# Altium schematic symbol library Schlib.SchLib: 725 symbols (part 3 of 6) (continued)
## ERJ-2RKF2000X
designator R?  value 200R  (hidden comment: *)
Res Thick Film 0402 200 Ohm 1% 1/10W ±100ppm/°C Molded SMD Punched Carrier T/R; Manufacturer: Panasonic; Manufacturer Part Number: ERJ-2RKF2000X; Power Rating: 100mW; Voltage Rating: 50V; Supplier: Digi-Key; Supplier Part Number: P200LCT-ND; RoHS: Yes; Category: Chip SMD Resistors; Stock: 2687188; Pricing: 1=0.10000, 10=0.03400, 100=0.01390, 1000=0.00625, 2500=0.00543, 5000=0.00448 (USD); Mounting Technology: Surface Mount; Case/Package: 0402; Case Code (Metric): 1005; Case Code (Imperial): 0402; Contact Plating: Tin; Min Operating Temperature: -55°C; Max Operating Temperature: 155°C; Tolerance: 1%; Packaging: Tape and Reel; Package Quantity: 1; Resistor Type: Thick Film; Number of Terminations: 2; Termination: SMD/SMT; Temperature Coefficient: 100ppm/°C; Max Power Dissipation: 100mW; Voltage Rating (DC): 50V; Features: Automotive AEC-Q200; Series: ERJ; Technology: THICK FILM; Resistance Tolerance: 1%; Construction: Rectangular; Length: 1mm; Width: 0.5mm; Height: 0.35mm; Depth: 0.5mm; Radiation Hardening: No; Reach SVHC Compliant: Yes; Military Standard: Not; Lead Free: Lead Free; RoHS Compliant: Yes; ComponentLink1URL: https://datasheet.ciiva.com/43460/426256-43460283.pdf?src-supplier=Farnell; ComponentLink1Description: https://datasheet.ciiva.com/43460/426256-43460283.pdf?src-supplier=Farnell; ComponentLink2URL: https://datasheet.ciiva.com/22748/426256-22748296.pdf?src-supplier=Element14; ComponentLink2Description: https://datasheet.ciiva.com/22748/426256-22748296.pdf?src-supplier=Element14; ComponentLink3URL: https://datasheet.ciiva.com/6137/426256-6137544.pdf?src-supplier=Farnell; ComponentLink3Description: https://datasheet.ciiva.com/6137/426256-6137544.pdf?src-supplier=Farnell; ComponentLink4URL: https://datasheet.ciiva.com/22748/426256-22748294.pdf?src-supplier=Element14; ComponentLink4Description: https://datasheet.ciiva.com/22748/426256-22748294.pdf?src-supplier=Element14; ComponentLink5URL: https://datasheet.ciiva.com/22749/1678782-22749583.pdf?src-supplier=Element14; ComponentLink5Description: https://datasheet.ciiva.com/22749/1678782-22749583.pdf?src-supplier=Element14; ComponentLink6URL: https://datasheet.ciiva.com/28691/1678782-28691926.pdf?src-supplier=Element14; ComponentLink6Description: https://datasheet.ciiva.com/28691/1678782-28691926.pdf?src-supplier=Element14; ComponentLink7URL: https://datasheet.ciiva.com/24024/aoa0000ce2-24024252.pdf?src-supplier=Mouser; ComponentLink7Description: https://datasheet.ciiva.com/24024/aoa0000ce2-24024252.pdf?src-supplier=Mouser; ComponentLink8URL: https://datasheet.ciiva.com/16758/70260748-16758862.pdf?src-supplier=Allied+Electronics; ComponentLink8Description: https://datasheet.ciiva.com/16758/70260748-16758862.pdf?src-supplier=Allied+Electronics; ComponentLink9URL: https://datasheet.ciiva.com/9184/aoa0000ce2-9184574.pdf?src-supplier=Avnet; ComponentLink9Description: https://datasheet.ciiva.com/9184/aoa0000ce2-9184574.pdf?src-supplier=Avnet; ComponentLink10URL: https://datasheet.ciiva.com/16449/aoa0000ce2-16449365.pdf?src-supplier=Future+Electronics; ComponentLink10Description: https://datasheet.ciiva.com/16449/aoa0000ce2-16449365.pdf?src-supplier=Future+Electronics
footprint R 0402 (1005 Metric) (Chip Capacitor, Body 1.0x0.5mm, IPC High Density)
pins: 1 B, 2 A
1 alternate drawing of the same symbol

## ERJ-2RKF2002X
designator R?  value 20kR  (hidden comment: *)
Res Thick Film 0402 20K Ohm 1% 1/10W +/-100ppm/ßC Molded SMD Punched Carrier T/R; Manufacturer: Panasonic; Manufacturer Part Number: ERJ-2RKF2002X; Power Rating: 100mW; Voltage Rating: 50V; Temperature Coefficient: 100ppm/°C; Supplier: Digi-Key; Supplier Part Number: P20.0KLTR-ND; RoHS: Yes; Category: Chip SMD Resistors; Stock: 2592473; Pricing: 10000=0.00389, 30000=0.00342, 50000=0.00314, 100000=0.00308 (USD); Mounting Technology: Surface Mount; Case/Package: 0402; Case Code (Metric): 1005; Case Code (Imperial): 0402; Weight: 2.8E-05oz; Contact Plating: Tin; Min Operating Temperature: -55°C; Max Operating Temperature: 155°C; Tolerance: 1%; Packaging: Cut Tape; Package Quantity: 1; Resistor Type: Thick Film; Number of Terminations: 2; Termination: SMD/SMT; Max Power Dissipation: 100mW; Voltage Rating (DC): 50V; Features: Automotive AEC-Q200; Series: ERJ; Technology: THICK FILM; Resistance Tolerance: 1%; Construction: Rectangular; Length: 1mm; Width: 0.5mm; Height: 0.35mm; Depth: 0.5mm; Radiation Hardening: No; Reach SVHC Compliant: Yes; Military Standard: Not; Lead Free: Lead Free; RoHS Compliant: Yes; ComponentLink1URL: https://datasheet.ciiva.com/11821/0900766b80f80784-11821220.pdf?src-supplier=Rs; ComponentLink1Description: https://datasheet.ciiva.com/11821/0900766b80f80784-11821220.pdf?src-supplier=Rs; ComponentLink2URL: https://datasheet.ciiva.com/6138/426256-6138761.pdf?src-supplier=Farnell; ComponentLink2Description: https://datasheet.ciiva.com/6138/426256-6138761.pdf?src-supplier=Farnell; ComponentLink3URL: https://datasheet.ciiva.com/46377/426256-46377368.pdf?src-supplier=Element14; ComponentLink3Description: https://datasheet.ciiva.com/46377/426256-46377368.pdf?src-supplier=Element14; ComponentLink4URL: https://datasheet.ciiva.com/28688/1678782-28688600.pdf?src-supplier=Element14; ComponentLink4Description: https://datasheet.ciiva.com/28688/1678782-28688600.pdf?src-supplier=Element14; ComponentLink5URL: https://datasheet.ciiva.com/24159/aoa0000ce2-24159274.pdf?src-supplier=Mouser; ComponentLink5Description: https://datasheet.ciiva.com/24159/aoa0000ce2-24159274.pdf?src-supplier=Mouser; ComponentLink6URL: https://datasheet.ciiva.com/16782/70260748-16782455.pdf?src-supplier=Allied+Electronics; ComponentLink6Description: https://datasheet.ciiva.com/16782/70260748-16782455.pdf?src-supplier=Allied+Electronics; ComponentLink7URL: https://datasheet.ciiva.com/16762/70260748-16762885.pdf?src-supplier=Allied+Electronics; ComponentLink7Description: https://datasheet.ciiva.com/16762/70260748-16762885.pdf?src-supplier=Allied+Electronics; ComponentLink8URL: https://datasheet.ciiva.com/16508/aoa0000ce2-16508524.pdf?src-supplier=Future+Electronics; ComponentLink8Description: https://datasheet.ciiva.com/16508/aoa0000ce2-16508524.pdf?src-supplier=Future+Electronics; ComponentLink9URL: https://datasheet.ciiva.com/48531/aoa0000ce2-48531063.pdf?src-supplier=Avnet; ComponentLink9Description: https://datasheet.ciiva.com/48531/aoa0000ce2-48531063.pdf?src-supplier=Avnet; ComponentLink10URL: https://datasheet.ciiva.com/30049/aoa0000ce2-30049982.pdf?src-supplier=Onlinecomponents.com; ComponentLink10Description: https://datasheet.ciiva.com/30049/aoa0000ce2-30049982.pdf?src-supplier=Onlinecomponents.com
footprint R 0402 (1005 Metric) (Chip Capacitor, Body 1.0x0.5mm, IPC High Density)
pins: 1 B, 2 A

## ERJ-2RKF2003X
designator R?  value 200kR  (hidden comment: *)
RES SMD 200K OHM 1% 1/10W 0402; Manufacturer: Panasonic; Manufacturer Part Number: ERJ-2RKF2003X; Power Rating: 100mW; Voltage Rating: 50V; Temperature Coefficient: 100ppm/°C; Supplier: Digi-Key; Supplier Part Number: P200KLCT-ND; RoHS: Yes; Category: Chip SMD Resistors; Stock: 785672; Pricing: 1=0.10000, 10=0.03400, 100=0.01390, 1000=0.00625, 2500=0.00543, 5000=0.00448 (USD); Mounting Technology: Surface Mount; Case/Package: 0402; Pins: 2; Case Code (Imperial): 0402; Case Code (Metric): 1005; Contact Plating: Tin; Package Shape: Rectangular; Min Operating Temperature: -55°C; Max Operating Temperature: 155°C; Tolerance: 1%; Packaging: Tape and Reel; Package Quantity: 1; Termination: SMD/SMT; Resistor Type: Thick Film; Number of Terminations: 2; Max Power Dissipation: 100mW; Voltage Rating (DC): 50V; Features: Automotive AEC-Q200; Technology: THICK FILM; Length: 1mm; Width: 0.5mm; Height: 0.35mm; Depth: 0.5mm; Radiation Hardening: No; Reach SVHC Compliant: Yes; Military Standard: Not; Lead Free: Lead Free; RoHS Compliant: Yes
footprint R 0402 (1005 Metric) (Chip Capacitor, Body 1.0x0.5mm, IPC High Density)
pins: 1 B, 2 A

## ERJ-2RKF2103X
designator R?  value 210kR  (hidden comment: *)
SMD Chip Resistor, 210 kOhm, ± 1%, 100 mW, 0402 [1005 Metric], Thick Film, Precision; Manufacturer: Panasonic; Manufacturer Part Number: ERJ-2RKF2103X; Supplier: Digikey; Supplier Part Number: P210KLCT-ND; RoHS: Yes; Category: Chip SMD Resistors; Stock: 76576; Pricing: 1=0.1, 10=0.024, 50=0.0152, 100=0.0127, 500=0.00866, 1000=0.00746, 5000=0.00542 (USD); ComponentLink1URL: https://datasheet.ciiva.com/24026/aoa0000ce2-24026251.pdf?src-supplier=Mouser; ComponentLink1Description: https://datasheet.ciiva.com/24026/aoa0000ce2-24026251.pdf?src-supplier=Mouser; ComponentLink2URL: https://datasheet.ciiva.com/46373/1678782-46373144.pdf?src-supplier=Element14; ComponentLink2Description: https://datasheet.ciiva.com/46373/1678782-46373144.pdf?src-supplier=Element14; ComponentLink3URL: https://datasheet.ciiva.com/46373/1678782-46373145.pdf?src-supplier=Element14; ComponentLink3Description: https://datasheet.ciiva.com/46373/1678782-46373145.pdf?src-supplier=Element14; ComponentLink4URL: https://datasheet.ciiva.com/22673/1678782-22673338.pdf?src-supplier=Element14; ComponentLink4Description: https://datasheet.ciiva.com/22673/1678782-22673338.pdf?src-supplier=Element14; ComponentLink5URL: https://datasheet.ciiva.com/28531/1694929-28531417.pdf?src-supplier=Element14; ComponentLink5Description: https://datasheet.ciiva.com/28531/1694929-28531417.pdf?src-supplier=Element14; ComponentLink6URL: https://datasheet.ciiva.com/16770/70260748-16770519.pdf?src-supplier=Allied+Electronics; ComponentLink6Description: https://datasheet.ciiva.com/16770/70260748-16770519.pdf?src-supplier=Allied+Electronics; ComponentLink7URL: https://datasheet.ciiva.com/9184/aoa0000ce2-9184527.pdf?src-supplier=Avnet; ComponentLink7Description: https://datasheet.ciiva.com/9184/aoa0000ce2-9184527.pdf?src-supplier=Avnet; ComponentLink8URL: https://datasheet.ciiva.com/30072/aoa0000ce2-30072110.pdf?src-supplier=Onlinecomponents.com; ComponentLink8Description: https://datasheet.ciiva.com/30072/aoa0000ce2-30072110.pdf?src-supplier=Onlinecomponents.com; ComponentLink9URL: https://datasheet.ciiva.com/7712/1678782-7712806.pdf?src-supplier=Element14; ComponentLink9Description: https://datasheet.ciiva.com/7712/1678782-7712806.pdf?src-supplier=Element14; Case/Package: 0402
footprint R 0402 (1005 Metric) (Chip Capacitor, Body 1.0x0.5mm, IPC High Density)
pins: 1 B, 2 A

## ERJ-2RKF2201X
designator R?  value 2.2kR  (hidden comment: *)
RES SMD 2.2K OHM 1% 1/10W 0402; Manufacturer: Panasonic; Manufacturer Part Number: ERJ-2RKF2201X; Temperature Coefficient: 100ppm/°C; Power Rating: 100mW; Voltage Rating: 50V; Supplier: Digi-Key; Supplier Part Number: P2.20KLCT-ND; RoHS: Yes; Category: Chip SMD Resistors; Stock: 3525012; Pricing: 1=0.10000, 10=0.03400, 100=0.01390, 1000=0.00625, 2500=0.00543, 5000=0.00448 (USD); Mounting Technology: Surface Mount; Case/Package: 0402; Pins: 2; Contact Plating: Tin; Case Code (Imperial): 0402; Case Code (Metric): 1005; Weight: 2.8E-05oz; Min Operating Temperature: -55°C; Max Operating Temperature: 155°C; Tolerance: 1%; Resistor Type: Thick Film; Packaging: Tape and Reel; Package Quantity: 1; Termination: SMD/SMT; Number of Terminations: 2; Max Power Dissipation: 100mW; Voltage Rating (DC): 50V; Features: Automotive AEC-Q200; Series: ERJ; Resistance Tolerance: 1%; Construction: Rectangular; Technology: THICK FILM; Length: 1mm; Width: 0.5mm; Height: 0.35mm; Depth: 0.5mm; Radiation Hardening: No; Reach SVHC Compliant: Yes; Military Standard: Not; Lead Free: Lead Free; RoHS Compliant: Yes; ComponentLink1URL: https://datasheet.ciiva.com/11821/0900766b80f80784-11821273.pdf?src-supplier=Rs; ComponentLink1Description: https://datasheet.ciiva.com/11821/0900766b80f80784-11821273.pdf?src-supplier=Rs; ComponentLink2URL: https://datasheet.ciiva.com/7830/aoa0000ce2-7830726.pdf?src-supplier=Element14; ComponentLink2Description: https://datasheet.ciiva.com/7830/aoa0000ce2-7830726.pdf?src-supplier=Element14; ComponentLink3URL: https://datasheet.ciiva.com/43467/1678782-43467343.pdf?src-supplier=Farnell; ComponentLink3Description: https://datasheet.ciiva.com/43467/1678782-43467343.pdf?src-supplier=Farnell; ComponentLink4URL: https://datasheet.ciiva.com/46372/1678782-46372732.pdf?src-supplier=Element14; ComponentLink4Description: https://datasheet.ciiva.com/46372/1678782-46372732.pdf?src-supplier=Element14; ComponentLink5URL: https://datasheet.ciiva.com/28584/1678782-28584091.pdf?src-supplier=Element14; ComponentLink5Description: https://datasheet.ciiva.com/28584/1678782-28584091.pdf?src-supplier=Element14; ComponentLink6URL: https://datasheet.ciiva.com/46372/1678782-46372733.pdf?src-supplier=Element14; ComponentLink6Description: https://datasheet.ciiva.com/46372/1678782-46372733.pdf?src-supplier=Element14; ComponentLink7URL: https://datasheet.ciiva.com/16759/70260748-16759436.pdf?src-supplier=Allied+Electronics; ComponentLink7Description: https://datasheet.ciiva.com/16759/70260748-16759436.pdf?src-supplier=Allied+Electronics; ComponentLink8URL: https://datasheet.ciiva.com/16780/70260748-16780438.pdf?src-supplier=Allied+Electronics; ComponentLink8Description: https://datasheet.ciiva.com/16780/70260748-16780438.pdf?src-supplier=Allied+Electronics; ComponentLink9URL: https://datasheet.ciiva.com/9197/aoa0000ce2-9197306.pdf?src-supplier=Avnet; ComponentLink9Description: https://datasheet.ciiva.com/9197/aoa0000ce2-9197306.pdf?src-supplier=Avnet; ComponentLink10URL: https://datasheet.ciiva.com/16426/aoa0000ce2-16426745.pdf?src-supplier=Future+Electronics; ComponentLink10Description: https://datasheet.ciiva.com/16426/aoa0000ce2-16426745.pdf?src-supplier=Future+Electronics; ComponentLink11URL: https://datasheet.ciiva.com/48531/aoa0000ce2-48531066.pdf?src-supplier=Avnet; ComponentLink11Description: https://datasheet.ciiva.com/48531/aoa0000ce2-48531066.pdf?src-supplier=Avnet
footprint R 0402 (1005 Metric) (Chip Capacitor, Body 1.0x0.5mm, IPC High Density)
pins: 1 B, 2 A

## ERJ-2RKF2322X
designator R?  value 23.2kR  (hidden comment: *)
SMD Chip Resistor, 23.2 kOhm, ± 1%, 100 mW, 0402 [1005 Metric], Thick Film, Precision; Manufacturer: Panasonic; Manufacturer Part Number: ERJ-2RKF2322X; Voltage Rating (DC): 50V; Power Rating: 100mW; Temperature Coefficient: 100ppm/°C; Supplier: Digikey; Supplier Part Number: P23.2KLCT-ND; RoHS: Yes; Category: Chip SMD Resistors; Stock: 9034; Pricing: 1=0.1, 10=0.024, 50=0.0152, 100=0.0127, 500=0.00866, 1000=0.00746, 5000=0.00542 (USD); Mounting Technology: Surface Mount; Case/Package: 0402; Case Code (Metric): 1005; Case Code (Imperial): 0402; Contact Plating: Tin; Min Operating Temperature: -55°C; Max Operating Temperature: 155°C; Tolerance: 1%; Voltage Rating: 50V; Packaging: Tape and Reel; Package Quantity: 10000; Resistor Type: Thick Film; Number of Terminations: 2; Termination: SMD/SMT; Max Power Dissipation: 100mW; Features: Automotive AEC-Q200; Series: ERJ; Resistance Tolerance: 1%; Construction: Rectangular; Length: 1mm; Width: 0.5mm; Height: 0.35mm; Depth: 0.5mm; Ratings: AEC-Q200; Radiation Hardening: No; Reach SVHC Compliant: Yes; Military Standard: Not; RoHS Compliant: Yes; Lead Free: 5697LeadFree; ComponentLink1URL: https://datasheet.ciiva.com/22668/1678782-22668630.pdf?src-supplier=Element14; ComponentLink1Description: https://datasheet.ciiva.com/22668/1678782-22668630.pdf?src-supplier=Element14; ComponentLink2URL: https://datasheet.ciiva.com/46372/1678782-46372991.pdf?src-supplier=Element14; ComponentLink2Description: https://datasheet.ciiva.com/46372/1678782-46372991.pdf?src-supplier=Element14
footprint R 0402 (1005 Metric) (Chip Capacitor, Body 1.0x0.5mm, IPC High Density)
pins: 1 B, 2 A

## ERJ-2RKF2401X
designator R?  value 2.4kR  (hidden comment: *)
Res Thick Film 0402 2.4K Ohm 1% 0.1W ±100ppm/°C Molded SMD Punched Carrier T/R; Manufacturer: Panasonic; Manufacturer Part Number: ERJ-2RKF2401X; Power Rating: 100mW; Voltage Rating: 50V; Supplier: Mouser; Supplier Part Number: 667-ERJ-2RKF2401X; RoHS: Yes; Category: Chip SMD Resistors; Stock: 69566; Pricing: 1=0.1, 10=0.016, 50=0.016, 100=0.009, 1000=0.007, 10000=0.004 (USD); Mounting Technology: Surface Mount; Case/Package: 0402; Case Code (Metric): 1005; Case Code (Imperial): 0402; Contact Plating: Tin; Min Operating Temperature: -55°C; Max Operating Temperature: 155°C; Tolerance: 1%; Packaging: Tape and Reel; Package Quantity: 10000; Resistor Type: Thick Film; Number of Terminations: 2; Termination: SMD/SMT; Temperature Coefficient: 100ppm/°C; Max Power Dissipation: 100mW; Voltage Rating (DC): 50V; Series: ERJ; Resistance Tolerance: 1%; Technology: THICK FILM; Construction: Rectangular; Length: 1mm; Width: 0.5mm; Height: 0.35mm; Depth: 0.5mm; Reach SVHC Compliant: No; Military Standard: Not; Lead Free: Lead Free; RoHS Compliant: Yes; ComponentLink1URL: https://datasheet.ciiva.com/11821/0900766b80f80784-11821271.pdf?src-supplier=Rs; ComponentLink1Description: https://datasheet.ciiva.com/11821/0900766b80f80784-11821271.pdf?src-supplier=Rs; ComponentLink2URL: https://datasheet.ciiva.com/16759/70260748-16759852.pdf?src-supplier=Allied+Electronics; ComponentLink2Description: https://datasheet.ciiva.com/16759/70260748-16759852.pdf?src-supplier=Allied+Electronics; ComponentLink3URL: https://datasheet.ciiva.com/30095/aoa0000ce2-30095942.pdf?src-supplier=Onlinecomponents.com; ComponentLink3Description: https://datasheet.ciiva.com/30095/aoa0000ce2-30095942.pdf?src-supplier=Onlinecomponents.com; ComponentLink4URL: https://datasheet.ciiva.com/22673/1678782-22673273.pdf?src-supplier=Element14; ComponentLink4Description: https://datasheet.ciiva.com/22673/1678782-22673273.pdf?src-supplier=Element14; ComponentLink5URL: https://datasheet.ciiva.com/28565/1694929-28565018.pdf?src-supplier=Element14; ComponentLink5Description: https://datasheet.ciiva.com/28565/1694929-28565018.pdf?src-supplier=Element14; ComponentLink6URL: https://datasheet.ciiva.com/46373/1678782-46373087.pdf?src-supplier=Element14; ComponentLink6Description: https://datasheet.ciiva.com/46373/1678782-46373087.pdf?src-supplier=Element14
footprint R 0402 (1005 Metric) (Chip Capacitor, Body 1.0x0.5mm, IPC High Density)
pins: 1 B, 2 A

## ERJ-2RKF2700X
designator R?  value 270R  (hidden comment: *)
Res Thick Film 0402 270 Ohm 1% 0.1W(1/10W) +/-100ppm/C Molded SMD Automotive Punched T/R; Manufacturer: Panasonic; Manufacturer Part Number: ERJ-2RKF2700X; Temperature Coefficient: 100ppm/°C; Power Rating: 100mW; Voltage Rating: 50V; Supplier 1: Digi-Key; RoHS: Yes; Category: Chip SMD Resistors; Stock 1: 46983; Pricing 1: 1=0.10000, 10=0.03400, 100=0.01390, 1000=0.00625, 2500=0.00543, 5000=0.00448 (USD); Mount: Surface Mount; Case/Package: 0402; Number of Pins: 2; Contact Plating: Tin; Case Code (Metric): 1005; Case Code (Imperial): 0402; Min Operating Temperature: -55°C; Max Operating Temperature: 155°C; Tolerance: 1%; Resistor Type: Thick Film; Packaging: Tape and Reel; Package Quantity: 10000; Number of Terminations: 2; Termination: SMD/SMT; Max Power Dissipation: 100mW; Voltage Rating (DC): 50V; Features: Automotive AEC-Q200; Series: ERJ; Resistance Tolerance: 1%; Construction: Rectangular; Technology: THICK FILM; Length: 1mm; Width: 0.5mm; Height: 0.35mm; Depth: 0.5mm; Ratings: AEC-Q200; Radiation Hardening: No; Reach SVHC Compliant: Yes; Military Standard: Not; Lead Free: Lead Free; RoHS Compliant: Yes; ComponentLink1URL: https://datasheet.ciiva.com/11821/0900766b80f80784-11821240.pdf?src-supplier=Rs; ComponentLink1Description: https://datasheet.ciiva.com/11821/0900766b80f80784-11821240.pdf?src-supplier=Rs; ComponentLink2URL: https://datasheet.ciiva.com/5860/aoa0000ce2-5860650.pdf?src-supplier=Farnell; ComponentLink2Description: https://datasheet.ciiva.com/5860/aoa0000ce2-5860650.pdf?src-supplier=Farnell; ComponentLink3URL: https://datasheet.ciiva.com/7944/aoa0000ce2-7944606.pdf?src-supplier=Element14; ComponentLink3Description: https://datasheet.ciiva.com/7944/aoa0000ce2-7944606.pdf?src-supplier=Element14; ComponentLink4URL: https://datasheet.ciiva.com/7944/aoa0000ce2-7944940.pdf?src-supplier=Element14; ComponentLink4Description: https://datasheet.ciiva.com/7944/aoa0000ce2-7944940.pdf?src-supplier=Element14; ComponentLink5URL: https://datasheet.ciiva.com/43467/1678782-43467257.pdf?src-supplier=Farnell; ComponentLink5Description: https://datasheet.ciiva.com/43467/1678782-43467257.pdf?src-supplier=Farnell; ComponentLink6URL: https://datasheet.ciiva.com/46373/1678782-46373915.pdf?src-supplier=Element14; ComponentLink6Description: https://datasheet.ciiva.com/46373/1678782-46373915.pdf?src-supplier=Element14; ComponentLink7URL: https://datasheet.ciiva.com/22705/1678782-22705421.pdf?src-supplier=Element14; ComponentLink7Description: https://datasheet.ciiva.com/22705/1678782-22705421.pdf?src-supplier=Element14; ComponentLink8URL: https://datasheet.ciiva.com/46373/1678782-46373916.pdf?src-supplier=Element14; ComponentLink8Description: https://datasheet.ciiva.com/46373/1678782-46373916.pdf?src-supplier=Element14; ComponentLink9URL: https://datasheet.ciiva.com/24069/aoa0000ce2-24069133.pdf?src-supplier=Mouser; ComponentLink9Description: https://datasheet.ciiva.com/24069/aoa0000ce2-24069133.pdf?src-supplier=Mouser; ComponentLink10URL: https://datasheet.ciiva.com/16766/70260748-16766103.pdf?src-supplier=Allied+Electronics; ComponentLink10Description: https://datasheet.ciiva.com/16766/70260748-16766103.pdf?src-supplier=Allied+Electronics; ComponentLink11URL: https://datasheet.ciiva.com/16767/70260748-16767359.pdf?src-supplier=Allied+Electronics; ComponentLink11Description: https://datasheet.ciiva.com/16767/70260748-16767359.pdf?src-supplier=Allied+Electronics; ComponentLink12URL: https://datasheet.ciiva.com/9183/aoa0000ce2-9183566.pdf?src-supplier=Avnet; ComponentLink12Description: https://datasheet.ciiva.com/9183/aoa0000ce2-9183566.pdf?src-supplier=Avnet; ComponentLink13URL: https://datasheet.ciiva.com/9183/aoa0000ce2-9183598.pdf?src-supplier=Avnet; ComponentLink13Description: https://datasheet.ciiva.com/9183/aoa0000ce2-9183598.pdf?src-supplier=Avnet; ComponentLink14URL: https://datasheet.ciiva.com/30198/aoa0000ce2-30198389.pdf?src-supplier=Onlinecomponents.com; ComponentLink14Description: https://datasheet.ciiva.com/30198/aoa0000ce2-30198389.pdf?src-supplier=Onlinecomponents.com; Supplier Part Number 1: P270LCT-ND
footprint R 0402 (1005 Metric) (Chip Capacitor, Body 1.0x0.5mm, IPC High Density)
pins: 1 B, 2 A

## ERJ-2RKF2703X
designator R?  value 270kR  (hidden comment: *)
Res Thick Film 0402 270K Ohm 1% 1/10W ±100ppm/°C Molded SMD Punched Carrier T/R; Manufacturer: Panasonic; Manufacturer Part Number: ERJ-2RKF2703X; Power Rating: 100mW; Voltage Rating: 50V; Supplier 1: Avnet; RoHS: Yes; Category: Chip SMD Resistors; Stock 1: 40000; Pricing 1: 10000=0.00276 (USD); Mount: Surface Mount; Case/Package: 0402; Number of Pins: 2; Contact Plating: Tin; Case Code (Metric): 1005; Case Code (Imperial): 0402; Min Operating Temperature: -55°C; Max Operating Temperature: 155°C; Tolerance: 1%; Resistor Type: Thick Film; Temperature Coefficient: 100ppm/°C; Packaging: Tape and Reel; Package Quantity: 1; Number of Terminations: 2; Termination: SMD/SMT; Max Power Dissipation: 100mW; Voltage Rating (DC): 50V; Features: Automotive AEC-Q200; Series: ERJ; Resistance Tolerance: 1%; Construction: Rectangular; Technology: THICK FILM; Length: 1mm; Width: 0.02inch; Height: 0.35mm; Depth: 0.5mm; Radiation Hardening: No; Reach SVHC Compliant: No; Military Standard: Not; RoHS Compliant: Yes; ComponentLink1URL: https://datasheet.ciiva.com/11821/0900766b80f80784-11821242.pdf?src-supplier=Rs; ComponentLink1Description: https://datasheet.ciiva.com/11821/0900766b80f80784-11821242.pdf?src-supplier=Rs; ComponentLink2URL: https://datasheet.ciiva.com/43467/1678782-43467518.pdf?src-supplier=Farnell; ComponentLink2Description: https://datasheet.ciiva.com/43467/1678782-43467518.pdf?src-supplier=Farnell; ComponentLink3URL: https://datasheet.ciiva.com/24027/aoa0000ce2-24027225.pdf?src-supplier=Mouser; ComponentLink3Description: https://datasheet.ciiva.com/24027/aoa0000ce2-24027225.pdf?src-supplier=Mouser; ComponentLink4URL: https://datasheet.ciiva.com/16764/70260748-16764782.pdf?src-supplier=Allied+Electronics; ComponentLink4Description: https://datasheet.ciiva.com/16764/70260748-16764782.pdf?src-supplier=Allied+Electronics; ComponentLink5URL: https://datasheet.ciiva.com/9183/aoa0000ce2-9183627.pdf?src-supplier=Avnet; ComponentLink5Description: https://datasheet.ciiva.com/9183/aoa0000ce2-9183627.pdf?src-supplier=Avnet; ComponentLink6URL: https://datasheet.ciiva.com/30210/aoa0000ce2-30210924.pdf?src-supplier=Onlinecomponents.com; ComponentLink6Description: https://datasheet.ciiva.com/30210/aoa0000ce2-30210924.pdf?src-supplier=Onlinecomponents.com; ComponentLink7URL: https://datasheet.ciiva.com/7836/aoa0000ce2-7836488.pdf?src-supplier=Element14; ComponentLink7Description: https://datasheet.ciiva.com/7836/aoa0000ce2-7836488.pdf?src-supplier=Element14; ComponentLink8URL: https://datasheet.ciiva.com/46373/1678782-46373707.pdf?src-supplier=Element14; ComponentLink8Description: https://datasheet.ciiva.com/46373/1678782-46373707.pdf?src-supplier=Element14; ComponentLink9URL: https://datasheet.ciiva.com/22682/1678782-22682172.pdf?src-supplier=Element14; ComponentLink9Description: https://datasheet.ciiva.com/22682/1678782-22682172.pdf?src-supplier=Element14; ComponentLink10URL: https://datasheet.ciiva.com/22687/1678782-22687384.pdf?src-supplier=Element14; ComponentLink10Description: https://datasheet.ciiva.com/22687/1678782-22687384.pdf?src-supplier=Element14; ComponentLink11URL: https://datasheet.ciiva.com/22742/426256-22742877.pdf?src-supplier=Element14; ComponentLink11Description: https://datasheet.ciiva.com/22742/426256-22742877.pdf?src-supplier=Element14; ComponentLink12URL: https://datasheet.ciiva.com/46373/1678782-46373708.pdf?src-supplier=Element14; ComponentLink12Description: https://datasheet.ciiva.com/46373/1678782-46373708.pdf?src-supplier=Element14; ComponentLink13URL: https://datasheet.ciiva.com/16785/70260748-16785580.pdf?src-supplier=Allied+Electronics; ComponentLink13Description: https://datasheet.ciiva.com/16785/70260748-16785580.pdf?src-supplier=Allied+Electronics; Supplier Part Number 1: ERJ-2RKF2703X
footprint R 0402 (1005 Metric) (Chip Capacitor, Body 1.0x0.5mm, IPC High Density)
pins: 1 B, 2 A

## ERJ-2RKF3000X
designator R?  value 300R  (hidden comment: *)
RES SMD 300 OHM 1% 1/10W 0402; Manufacturer: Panasonic; Manufacturer Part Number: ERJ-2RKF3000X; Supplier: Mouser; Supplier Part Number: 667-ERJ-2RKF3000X; RoHS: Yes; Category: Chip SMD Resistors; Stock: 1122601; Pricing: 1=0.1, 10=0.017, 50=0.017, 100=0.008, 1000=0.006, 10000=0.003 (USD); ComponentLink1URL: https://datasheet.ciiva.com/3883/3984280s8821682n1386-3883650.pdf?src-supplier=Arrow+Electronics; ComponentLink1Description: https://datasheet.ciiva.com/3883/3984280s8821682n1386-3883650.pdf?src-supplier=Arrow+Electronics; ComponentLink2URL: https://datasheet.ciiva.com/11821/0900766b80f80784-11821263.pdf?src-supplier=Rs; ComponentLink2Description: https://datasheet.ciiva.com/11821/0900766b80f80784-11821263.pdf?src-supplier=Rs; ComponentLink3URL: https://datasheet.ciiva.com/16765/70260748-16765494.pdf?src-supplier=Allied+Electronics; ComponentLink3Description: https://datasheet.ciiva.com/16765/70260748-16765494.pdf?src-supplier=Allied+Electronics; ComponentLink4URL: https://datasheet.ciiva.com/28565/1694929-28565023.pdf?src-supplier=Element14; ComponentLink4Description: https://datasheet.ciiva.com/28565/1694929-28565023.pdf?src-supplier=Element14; ComponentLink5URL: https://datasheet.ciiva.com/30068/aoa0000ce2-30068727.pdf?src-supplier=Onlinecomponents.com; ComponentLink5Description: https://datasheet.ciiva.com/30068/aoa0000ce2-30068727.pdf?src-supplier=Onlinecomponents.com; ComponentLink6URL: https://datasheet.ciiva.com/24068/aoa0000ce2-24068911.pdf?src-supplier=Mouser; ComponentLink6Description: https://datasheet.ciiva.com/24068/aoa0000ce2-24068911.pdf?src-supplier=Mouser; ComponentLink7URL: https://datasheet.ciiva.com/43467/1678782-43467261.pdf?src-supplier=Farnell; ComponentLink7Description: https://datasheet.ciiva.com/43467/1678782-43467261.pdf?src-supplier=Farnell; ComponentLink8URL: https://datasheet.ciiva.com/9183/aoa0000ce2-9183261.pdf?src-supplier=Avnet; ComponentLink8Description: https://datasheet.ciiva.com/9183/aoa0000ce2-9183261.pdf?src-supplier=Avnet; Case/Package: 0402
footprint R 0402 (1005 Metric) (Chip Capacitor, Body 1.0x0.5mm, IPC High Density)
pins: 1 B, 2 A

## ERJ-2RKF3301X
designator R?  value 3.3kR  (hidden comment: *)
Res Thick Film 0402 3.3K Ohm 1% 0.1W ±100ppm/°C Molded SMD Punched Carrier T/R; Manufacturer: Panasonic; Manufacturer Part Number: ERJ-2RKF3301X; Voltage Rating (DC): 50V; Supplier: Farnell; Supplier Part Number: 2302691; RoHS: Yes; Category: Chip SMD Resistors; Stock: 32564; Pricing: 10=0.0262, 100=0.0147, 500=0.0088, 2500=0.0061, 5000=0.006 (EUR); Lead Free: 5697LeadFree; ComponentLink1URL: https://datasheet.ciiva.com/11821/0900766b80f80784-11821314.pdf?src-supplier=Rs; ComponentLink1Description: https://datasheet.ciiva.com/11821/0900766b80f80784-11821314.pdf?src-supplier=Rs; ComponentLink2URL: https://datasheet.ciiva.com/6138/aoa0000ce2-6138172.pdf?src-supplier=Farnell; ComponentLink2Description: https://datasheet.ciiva.com/6138/aoa0000ce2-6138172.pdf?src-supplier=Farnell; ComponentLink3URL: https://datasheet.ciiva.com/43467/1678782-43467358.pdf?src-supplier=Farnell; ComponentLink3Description: https://datasheet.ciiva.com/43467/1678782-43467358.pdf?src-supplier=Farnell; ComponentLink4URL: https://datasheet.ciiva.com/46372/1678782-46372730.pdf?src-supplier=Element14; ComponentLink4Description: https://datasheet.ciiva.com/46372/1678782-46372730.pdf?src-supplier=Element14; ComponentLink5URL: https://datasheet.ciiva.com/46372/1678782-46372731.pdf?src-supplier=Element14; ComponentLink5Description: https://datasheet.ciiva.com/46372/1678782-46372731.pdf?src-supplier=Element14; ComponentLink6URL: https://datasheet.ciiva.com/22667/1678782-22667883.pdf?src-supplier=Element14; ComponentLink6Description: https://datasheet.ciiva.com/22667/1678782-22667883.pdf?src-supplier=Element14; ComponentLink7URL: https://datasheet.ciiva.com/22687/1678782-22687445.pdf?src-supplier=Element14; ComponentLink7Description: https://datasheet.ciiva.com/22687/1678782-22687445.pdf?src-supplier=Element14; ComponentLink8URL: https://datasheet.ciiva.com/16773/70260748-16773756.pdf?src-supplier=Allied+Electronics; ComponentLink8Description: https://datasheet.ciiva.com/16773/70260748-16773756.pdf?src-supplier=Allied+Electronics; ComponentLink9URL: https://datasheet.ciiva.com/16777/70260748-16777945.pdf?src-supplier=Allied+Electronics; ComponentLink9Description: https://datasheet.ciiva.com/16777/70260748-16777945.pdf?src-supplier=Allied+Electronics; ComponentLink10URL: https://datasheet.ciiva.com/30264/aoa0000ce2-30264303.pdf?src-supplier=Onlinecomponents.com; ComponentLink10Description: https://datasheet.ciiva.com/30264/aoa0000ce2-30264303.pdf?src-supplier=Onlinecomponents.com; ComponentLink11URL: https://datasheet.ciiva.com/7802/aoa0000ce2-7802408.pdf?src-supplier=Element14; ComponentLink11Description: https://datasheet.ciiva.com/7802/aoa0000ce2-7802408.pdf?src-supplier=Element14; Case/Package: 0402
footprint R 0402 (1005 Metric) (Chip Capacitor, Body 1.0x0.5mm, IPC High Density)
pins: 1 B, 2 A

## ERJ-2RKF3302X
designator R?  value 33kR  (hidden comment: *)
Res Thick Film 0402 33K Ohm 1% 0.1W(1/10W) +/-100ppm/C Molded SMD Automotive Punched T/R; Manufacturer: Panasonic; Manufacturer Part Number: ERJ-2RKF3302X; Temperature Coefficient: 100ppm/°C; Voltage Rating: 50V; Power Rating: 100mW; Supplier: Farnell; Supplier Part Number: 4014646; RoHS: Yes; Category: Chip SMD Resistors; Stock: 66438; Pricing: 10=0.0182, 100=0.0102, 500=0.0076, 2500=0.0061, 5000=0.0053, 10000=0.0044 (EUR); Mounting Technology: Surface Mount; Case/Package: 0402; Pins: 2; Contact Plating: Tin; Case Code (Metric): 1005; Case Code (Imperial): 0402; Min Operating Temperature: -55°C; Max Operating Temperature: 155°C; Tolerance: 1%; Resistor Type: Thick Film; Packaging: Tape and Reel; Package Quantity: 1; Number of Terminations: 2; Termination: SMD/SMT; Max Power Dissipation: 100mW; Features: Automotive AEC-Q200; Series: ERJ; Resistance Tolerance: 1%; Construction: Rectangular; Technology: THICK FILM; Voltage Rating (DC): 50V; Length: 1mm; Width: 0.5mm; Height: 0.35mm; Depth: 0.5mm; Reach SVHC Compliant: No; Military Standard: Not; RoHS Compliant: Yes; Lead Free: 5697LeadFree; ComponentLink1URL: https://datasheet.ciiva.com/11821/0900766b80f80784-11821294.pdf?src-supplier=Rs; ComponentLink1Description: https://datasheet.ciiva.com/11821/0900766b80f80784-11821294.pdf?src-supplier=Rs; ComponentLink2URL: https://datasheet.ciiva.com/7802/aoa0000ce2-7802409.pdf?src-supplier=Element14; ComponentLink2Description: https://datasheet.ciiva.com/7802/aoa0000ce2-7802409.pdf?src-supplier=Element14; ComponentLink3URL: https://datasheet.ciiva.com/22673/1678782-22673685.pdf?src-supplier=Element14; ComponentLink3Description: https://datasheet.ciiva.com/22673/1678782-22673685.pdf?src-supplier=Element14; ComponentLink4URL: https://datasheet.ciiva.com/22687/1678782-22687071.pdf?src-supplier=Element14; ComponentLink4Description: https://datasheet.ciiva.com/22687/1678782-22687071.pdf?src-supplier=Element14; ComponentLink5URL: https://datasheet.ciiva.com/22737/426256-22737285.pdf?src-supplier=Element14; ComponentLink5Description: https://datasheet.ciiva.com/22737/426256-22737285.pdf?src-supplier=Element14; ComponentLink6URL: https://datasheet.ciiva.com/46420/1678782-46420317.pdf?src-supplier=Element14; ComponentLink6Description: https://datasheet.ciiva.com/46420/1678782-46420317.pdf?src-supplier=Element14; ComponentLink7URL: https://datasheet.ciiva.com/24024/aoa0000ce2-24024398.pdf?src-supplier=Mouser; ComponentLink7Description: https://datasheet.ciiva.com/24024/aoa0000ce2-24024398.pdf?src-supplier=Mouser; ComponentLink8URL: https://datasheet.ciiva.com/16784/70260748-16784773.pdf?src-supplier=Allied+Electronics; ComponentLink8Description: https://datasheet.ciiva.com/16784/70260748-16784773.pdf?src-supplier=Allied+Electronics; ComponentLink9URL: https://datasheet.ciiva.com/9190/aoa0000ce2-9190679.pdf?src-supplier=Avnet; ComponentLink9Description: https://datasheet.ciiva.com/9190/aoa0000ce2-9190679.pdf?src-supplier=Avnet; ComponentLink10URL: https://datasheet.ciiva.com/30159/aoa0000ce2-30159014.pdf?src-supplier=Onlinecomponents.com; ComponentLink10Description: https://datasheet.ciiva.com/30159/aoa0000ce2-30159014.pdf?src-supplier=Onlinecomponents.com
footprint R 0402 (1005 Metric) (Chip Capacitor, Body 1.0x0.5mm, IPC High Density)
pins: 1 B, 2 A

## ERJ-2RKF3401X
designator R?  value 3.4kR  (hidden comment: *)
Res Thick Film 0402 3.4K Ohm 1% 1/10W ±100ppm/°C Molded SMD Punched Carrier T/R; Manufacturer: Panasonic; Manufacturer Part Number: ERJ-2RKF3401X; Voltage Rating (DC): 50V; Supplier: Mouser; Supplier Part Number: 667-ERJ-2RKF3401X; RoHS: Yes; Category: Chip SMD Resistors; Stock: 133092; Pricing: 1=0.1, 10=0.023, 50=0.023, 100=0.013, 1000=0.008, 10000=0.004 (USD); Lead Free: 5698LeadFree; ComponentLink1URL: https://datasheet.ciiva.com/6201/426256-6201358.pdf?src-supplier=Farnell; ComponentLink1Description: https://datasheet.ciiva.com/6201/426256-6201358.pdf?src-supplier=Farnell; ComponentLink2URL: https://datasheet.ciiva.com/9196/aoa0000ce2-9196415.pdf?src-supplier=Avnet; ComponentLink2Description: https://datasheet.ciiva.com/9196/aoa0000ce2-9196415.pdf?src-supplier=Avnet; ComponentLink3URL: https://datasheet.ciiva.com/24160/aoa0000ce2-24160133.pdf?src-supplier=Mouser; ComponentLink3Description: https://datasheet.ciiva.com/24160/aoa0000ce2-24160133.pdf?src-supplier=Mouser; ComponentLink4URL: https://datasheet.ciiva.com/30115/aoa0000ce2-30115213.pdf?src-supplier=Onlinecomponents.com; ComponentLink4Description: https://datasheet.ciiva.com/30115/aoa0000ce2-30115213.pdf?src-supplier=Onlinecomponents.com; ComponentLink5URL: https://datasheet.ciiva.com/16771/70260748-16771656.pdf?src-supplier=Allied+Electronics; ComponentLink5Description: https://datasheet.ciiva.com/16771/70260748-16771656.pdf?src-supplier=Allied+Electronics; ComponentLink6URL: https://datasheet.ciiva.com/16774/70260748-16774598.pdf?src-supplier=Allied+Electronics; ComponentLink6Description: https://datasheet.ciiva.com/16774/70260748-16774598.pdf?src-supplier=Allied+Electronics; ComponentLink7URL: https://datasheet.ciiva.com/46389/426256-46389135.pdf?src-supplier=Element14; ComponentLink7Description: https://datasheet.ciiva.com/46389/426256-46389135.pdf?src-supplier=Element14; Case/Package: 0402
footprint R 0402 (1005 Metric) (Chip Capacitor, Body 1.0x0.5mm, IPC High Density)
pins: 1 B, 2 A

## ERJ-2RKF3600X
designator R?  value 360R  (hidden comment: *)
SMD Chip Resistor, 360 Ohm, ± 1%, 100 mW, 0402 [1005 Metric], Thick Film, Precision; Manufacturer: Panasonic; Manufacturer Part Number: ERJ-2RKF3600X; Supplier: Mouser; Supplier Part Number: 667-ERJ-2RKF3600X; RoHS: Yes; Category: Chip SMD Resistors; Stock: 56357; Pricing: 1=0.1, 10=0.016, 50=0.016, 100=0.009, 1000=0.007, 10000=0.004 (USD); ComponentLink1URL: https://datasheet.ciiva.com/11821/0900766b80f80784-11821288.pdf?src-supplier=Rs; ComponentLink1Description: https://datasheet.ciiva.com/11821/0900766b80f80784-11821288.pdf?src-supplier=Rs; ComponentLink2URL: https://datasheet.ciiva.com/46373/1678782-46373574.pdf?src-supplier=Element14; ComponentLink2Description: https://datasheet.ciiva.com/46373/1678782-46373574.pdf?src-supplier=Element14; ComponentLink3URL: https://datasheet.ciiva.com/46373/1678782-46373575.pdf?src-supplier=Element14; ComponentLink3Description: https://datasheet.ciiva.com/46373/1678782-46373575.pdf?src-supplier=Element14; ComponentLink4URL: https://datasheet.ciiva.com/16780/70260748-16780349.pdf?src-supplier=Allied+Electronics; ComponentLink4Description: https://datasheet.ciiva.com/16780/70260748-16780349.pdf?src-supplier=Allied+Electronics; ComponentLink5URL: https://datasheet.ciiva.com/22681/1678782-22681164.pdf?src-supplier=Element14; ComponentLink5Description: https://datasheet.ciiva.com/22681/1678782-22681164.pdf?src-supplier=Element14; ComponentLink6URL: https://datasheet.ciiva.com/7795/1678782-7795527.pdf?src-supplier=Element14; ComponentLink6Description: https://datasheet.ciiva.com/7795/1678782-7795527.pdf?src-supplier=Element14; ComponentLink7URL: https://datasheet.ciiva.com/24068/aoa0000ce2-24068935.pdf?src-supplier=Mouser; ComponentLink7Description: https://datasheet.ciiva.com/24068/aoa0000ce2-24068935.pdf?src-supplier=Mouser; ComponentLink8URL: https://datasheet.ciiva.com/43467/1678782-43467269.pdf?src-supplier=Farnell; ComponentLink8Description: https://datasheet.ciiva.com/43467/1678782-43467269.pdf?src-supplier=Farnell; ComponentLink9URL: https://datasheet.ciiva.com/30221/aoa0000ce2-30221836.pdf?src-supplier=Onlinecomponents.com; ComponentLink9Description: https://datasheet.ciiva.com/30221/aoa0000ce2-30221836.pdf?src-supplier=Onlinecomponents.com; Case/Package: 0402
footprint R 0402 (1005 Metric) (Chip Capacitor, Body 1.0x0.5mm, IPC High Density)
pins: 1 B, 2 A
